# Altium footprint library 接口库PCB.PcbLib: 76 footprints (part 3 of 5)
Each footprint in its own frame and in the unit in brackets; x right, y up, seen from the top. Pads: shape width x height; smd on the part's side, far side on the other; paste and mask are expansions set on the pad; w line width, h text height; cw(c..) or ccw(c..) is an arc to the next point about the centre after c.
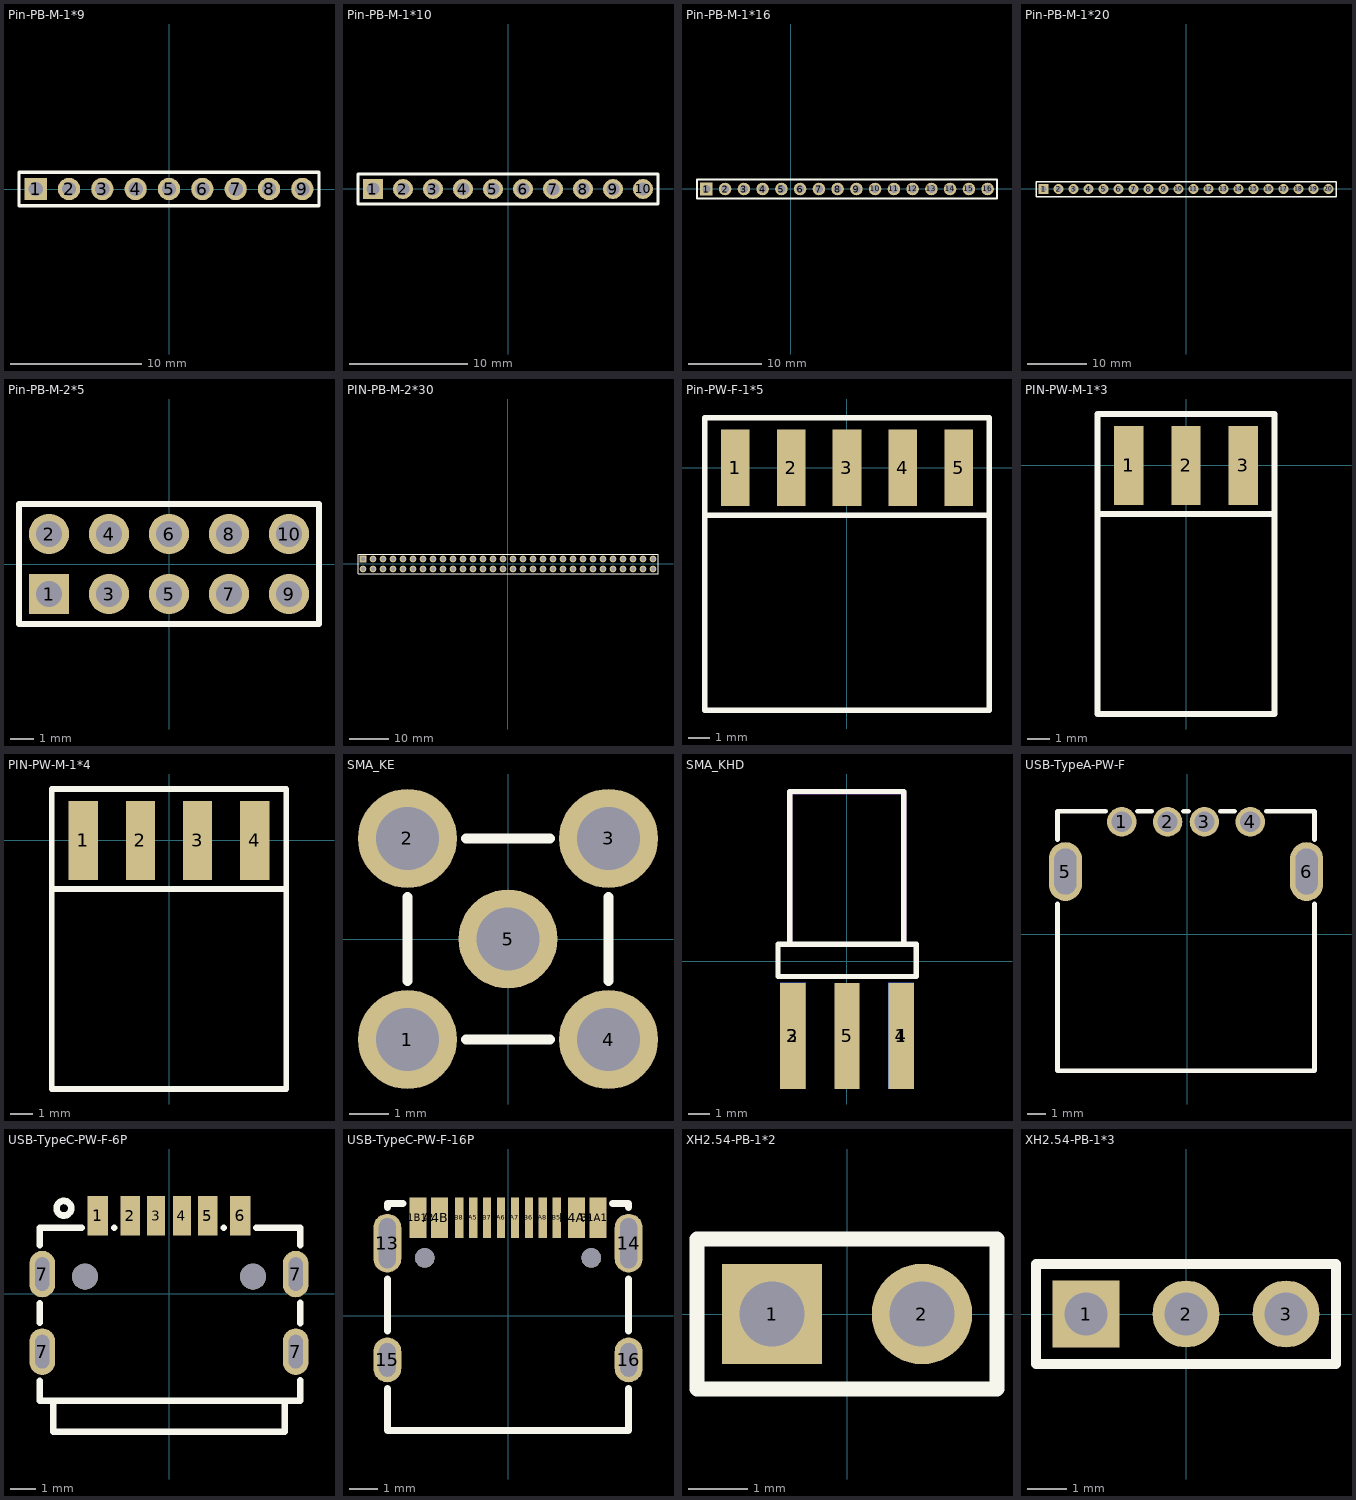
[diagram p2: the footprints below, top view; thin cyan lines are the x and y axes]

## Pin-PB-M-1*9 [mm]
pads (9):
  rect 1.7x1.7 hole 1.1: 1(-10.16,0)
  round 1.7 hole 1.1: 2(-7.62,0) 3(-5.08,0) 4(-2.54,0) 5(0,0) 6(2.54,0) 7(5.08,0) 8(7.62,0) 9(10.16,0)
Top Overlay:
  lines w0.254: -11.43,-1.27 11.43,-1.27 11.43,1.27 -11.43,1.27 -11.43,-1.27
3D body "9P.step": height 8.54, standoff -3, extent -11.43,-1.27 11.43,1.27

## Pin-PB-M-1*10 [mm]
pads (10):
  rect 1.7x1.7 hole 1.1: 1(-11.43,0)
  round 1.7 hole 1.1: 2(-8.89,0) 3(-6.35,0) 4(-3.81,0) 5(-1.27,0) 6(1.27,0) 7(3.81,0) 8(6.35,0) 9(8.89,0) 10(11.43,0)
Top Overlay:
  lines w0.254: -12.7,-1.27 12.7,-1.27 12.7,1.27 -12.7,1.27 -12.7,-1.27
3D body "10P.step": height 8.54, standoff -3, extent -12.7,-1.27 12.7,1.27

## Pin-PB-M-1*16 [mm]
pads (16):
  rect 1.7x1.7 hole 1.1: 1(-11.43,0)
  round 1.7 hole 1.1: 2(-8.89,0) 3(-6.35,0) 4(-3.81,0) 5(-1.27,0) 6(1.27,0) 7(3.81,0) 8(6.35,0) 9(8.89,0) 10(11.43,0) 11(13.97,0) 12(16.51,0) 13(19.05,0) 14(21.59,0) 15(24.13,0) 16(26.67,0)
Top Overlay:
  lines w0.254: -12.7,-1.27 27.94,-1.27 27.94,1.27 -12.7,1.27 -12.7,-1.27
3D body "6P.step": height 8.54, standoff -3, extent 12.7,-1.27 27.94,1.27
3D body "10P.step": height 8.54, standoff -3, extent -12.7,-1.27 12.7,1.27

## Pin-PB-M-1*20 [mm]
pads (20):
  rect 1.7x1.7 hole 1.1: 1(-24.13,0)
  round 1.7 hole 1.1: 2(-21.59,0) 3(-19.05,0) 4(-16.51,0) 5(-13.97,0) 6(-11.43,0) 7(-8.89,0) 8(-6.35,0) 9(-3.81,0) 10(-1.27,0) 11(1.27,0) 12(3.81,0) 13(6.35,0) 14(8.89,0) 15(11.43,0) 16(13.97,0) 17(16.51,0) 18(19.05,0) 19(21.59,0) 20(24.13,0)
Top Overlay:
  lines w0.254: -25.4,-1.27 25.4,-1.27 25.4,1.27 -25.4,1.27 -25.4,-1.27
3D body "20P.step": height 8.54, standoff -3, extent -25.4,-1.27 25.4,1.27

## Pin-PB-M-2*5 [mm]
pads (10):
  rect 1.7x1.7 hole 1.1: 1(-5.08,-1.27)
  round 1.7 hole 1.1: 2(-5.08,1.27) 3(-2.54,-1.27) 4(-2.54,1.27) 5(0,-1.27) 6(0,1.27) 7(2.54,-1.27) 8(2.54,1.27) 9(5.08,-1.27) 10(5.08,1.27)
Top Overlay:
  lines w0.254: -6.35,-2.54 6.35,-2.54 6.35,2.54 -6.35,2.54 -6.35,-2.54
3D body "5P2.step": height 8.54, standoff -3, extent -6.35,-2.54 6.35,2.54

## PIN-PB-M-2*30 [mm]
pads (60):
  rect 1.7x1.7 hole 1.1: 1(-36.83,1.27)
  round 1.7 hole 1.1: 2(-34.29,1.27) 3(-31.75,1.27) 4(-29.21,1.27) 5(-26.67,1.27) 6(-24.13,1.27) 7(-21.59,1.27) 8(-19.05,1.27) 9(-16.51,1.27) 10(-13.97,1.27) 11(-11.43,1.27) 12(-8.89,1.27) 13(-6.35,1.27) 14(-3.81,1.27) 15(-1.27,1.27) 16(1.27,1.27) 17(3.81,1.27) 18(6.35,1.27) 19(8.89,1.27) 20(11.43,1.27) 21(13.97,1.27) 22(16.51,1.27) 23(19.05,1.27) 24(21.59,1.27) 25(24.13,1.27) 26(26.67,1.27) 27(29.21,1.27) 28(31.75,1.27) 29(34.29,1.27) 30(36.83,1.27) 31(36.83,-1.27) 32(34.29,-1.27) 33(31.75,-1.27) 34(29.21,-1.27) 35(26.67,-1.27) 36(24.13,-1.27) 37(21.59,-1.27) 38(19.05,-1.27) 39(16.51,-1.27) 40(13.97,-1.27) 41(11.43,-1.27) 42(8.89,-1.27) 43(6.35,-1.27) 44(3.81,-1.27) 45(1.27,-1.27) 46(-1.27,-1.27) 47(-3.81,-1.27) 48(-6.35,-1.27) 49(-8.89,-1.27) 50(-11.43,-1.27) 51(-13.97,-1.27) 52(-16.51,-1.27) 53(-19.05,-1.27) 54(-21.59,-1.27) 55(-24.13,-1.27) 56(-26.67,-1.27) 57(-29.21,-1.27) 58(-31.75,-1.27) 59(-34.29,-1.27) 60(-36.83,-1.27)
Top Overlay:
  lines w0.254: -38.1,-2.54 38.1,-2.54 38.1,2.54 -38.1,2.54 -38.1,-2.54
3D body "10P.step": height 8.54, standoff -3, extent -38.1,-2.54 -12.7,0
3D body "10P.step": height 8.54, standoff -3, extent -12.7,-2.54 12.7,0
3D body "10P.step": height 8.54, standoff -3, extent 12.7,-2.54 38.1,0
3D body "10P.step": height 8.54, standoff -3, extent 12.7,0 38.1,2.54
3D body "10P.step": height 8.54, standoff -3, extent -12.7,0 12.7,2.54
3D body "10P.step": height 8.54, standoff -3, extent -38.1,0 -12.7,2.54

## Pin-PW-F-1*5 [mm]
pads (6):
  rect 1.3x3.5 smd: 1(-5.08,0) 1(-5.08,0) 2(-2.54,0) 3(0,0) 4(2.54,0) 5(5.08,0)
Top Overlay:
  lines w0.254: 3.937,-2.159 -6.477,-2.159 ; -6.477,-2.159 -6.477,-11.049 6.477,-11.049 6.477,-2.159 ; -6.477,-2.159 -6.477,2.286 6.477,2.286 6.477,-2.159 ; -6.477,-2.159 6.477,-2.159
3D body "5P.step": height 1.27, standoff -1.27, extent -6.35,-10.977 6.35,0.563

## PIN-PW-M-1*3 [mm]
pads (4):
  rect 1.3x3.5 smd: 1(-2.54,0) 1(-2.54,0) 2(0,0) 3(2.54,0)
Top Overlay:
  lines w0.254: -3.937,-11.049 3.937,-11.049 3.937,-2.159 ; -3.937,-11.049 -3.937,-2.159 ; -3.937,-11.049 -3.937,-2.159 ; -3.937,-2.159 3.937,-2.159 ; -3.937,-2.159 3.937,-2.159 ; -3.937,-2.159 -3.937,2.286 ; -3.937,-2.159 -3.937,2.286 ; -3.937,2.286 3.937,2.286 3.937,-2.159
3D body "3P.step": height 1.27, standoff -1.27, extent -3.81,-10.977 3.81,0.563

## PIN-PW-M-1*4 [mm]
pads (5):
  rect 1.3x3.5 smd: 1(-3.81,0) 1(-3.81,0) 2(-1.27,0) 3(1.27,0) 4(3.81,0)
Top Overlay:
  lines w0.254: -5.207,-2.159 5.207,-2.159 ; -5.207,-2.159 -5.207,2.286 5.207,2.286 5.207,-2.159 ; -5.207,-2.159 5.207,-2.159 ; -5.207,-2.159 -5.207,-11.049 5.207,-11.049 5.207,-2.159
3D body "4P.step": height 1.27, standoff -1.27, extent -5.08,-10.977 5.08,0.563

## SMA_KE [mm]
pads (5):
  round 2.5 hole 1.6: 1(-2.54,-2.54) 2(-2.54,2.54) 3(2.54,2.54) 4(2.54,-2.54) 5(0,0)
Top Overlay:
  lines w0.254: -2.54,-1.059 -2.54,1.059 ; -1.059,-2.54 1.059,-2.54 ; -1.059,2.54 1.059,2.54 ; 2.54,-1.059 2.54,1.059
Mechanical 15:
  lines w0.003: 1.143,0.127 1.143,0.127
3D body "User Library-sma.step": height 9.2, standoff -4.25, extent -3.155,-3.155 3.155,3.155

## SMA_KHD [mm]
pads (5):
  rect 1.2x5 smd: 1(2.55,-3.501) 2(-2.55,-3.501) 5(0,-3.501)
  rect 1.2x5 smd far side: 3(-2.55,-3.501) 4(2.55,-3.501)
Top Overlay:
  lines w0.254: -2.689,0.817 -2.689,7.444 -2.689,7.988 -2.7,7.999 2.68,7.999 ; 2.667,0.817 2.667,7.444 2.667,7.999 ; 3.175,-0.707 -3.25,-0.707 -3.25,0.817 3.25,0.817 3.25,-0.707
Mechanical 15:
  region: -2.81,0.929 -2.57,0.929 -2.57,7.879 2.55,7.879 2.55,0.929 2.79,0.929 2.79,7.999 2.67,8.119 -2.72,8.119 -2.81,8.029
3D body "ALSRobot-SMA-KHD19A (1).step": height 3.2, standoff -2.9, extent -3.075,-5.575 3.025,7.925

## USB-TypeA-PW-F [mm]
pads (6):
  round 1.6 hole 1.1: 1(-3.577,6.134) 2(-1.077,6.134) 3(0.923,6.134) 4(3.423,6.134)
  oval 1.8x3.2 hole 1.2 slot 2.5 at 90 deg: 5(-6.646,3.425) 6(6.492,3.424)
Top Overlay:
  lines w0.254: -7.077,1.679 -7.077,-6.9 -7.077,-7.431 5.676,-7.431 6.923,-7.431 ; -7.077,5.171 -7.077,6.7 -4.439,6.7 ; -2.715,6.7 -1.939,6.7 ; -0.215,6.7 0.061,6.7 ; 1.785,6.7 2.561,6.7 ; 4.285,6.7 6.923,6.7 6.923,5.171 ; 6.923,-7.101 6.923,-7.431 ; 6.923,1.679 6.923,-7.431
3D body "usb_a-usbsa.stp": height 7, standoff -4.5, extent -7.8,-7.088 7.8,7.112

## USB-TypeC-PW-F-6P [mm]
pads (12):
  rect 0.8x1.524 smd: 1(-2.75,3.016) 6(2.75,3.016)
  rect 0.76x1.524 smd: 2(-1.5,3.016) 5(1.5,3.016)
  rect 0.7x1.524 smd: 3(-0.5,3.016) 4(0.5,3.016)
  oval 1x1.8 hole 0.55 slot 1.3 at 90 deg: 7(-4.9,-2.234) 7(-4.9,0.766) 7(4.9,0.766) 7(4.9,-2.234)
  round 1 hole 1 unplated: ""(-3.25,0.666) ""(3.25,0.666)
Top Overlay:
  circle w0.254: c-4.064,3.312 r0.284
  lines w0.254: -5,-3.358 -5,-4.134 5,-4.134 ; -5,-1.11 -5,-0.358 ; -5,1.89 -5,2.55 -3.381,2.55 ; -4.47,-4.134 -4.47,-5.334 4.47,-5.334 4.47,-4.134 ; -2.119,2.55 -2.111,2.55 ; 2.111,2.55 2.119,2.55 ; 3.381,2.55 4.953,2.55 5.08,2.55 5.08,1.875 ; 5.08,-4.134 5.08,-3.341 5.08,-3.343 ; 5.08,-1.127 5.08,-0.341 ; 5.08,-1.125 5.08,-0.343 ; -5,-0.358 -5,-0.358
Top Paste:
  region: -5.4,-1.834 -5.4,-1.735 -5.324,-1.551 -5.183,-1.41 -4.999,-1.334 -4.801,-1.334 -4.617,-1.41 -4.476,-1.551 -4.4,-1.735 -4.4,-1.834 -4.4,-2.634 -4.4,-2.733 -4.476,-2.917 -4.617,-3.058 -4.801,-3.134 -4.999,-3.134 -5.183,-3.058 -5.324,-2.917 -5.4,-2.733 -5.4,-2.634
  region: -5.4,1.166 -5.4,1.265 -5.324,1.449 -5.183,1.59 -4.999,1.666 -4.801,1.666 -4.617,1.59 -4.476,1.449 -4.4,1.265 -4.4,1.166 -4.4,0.366 -4.4,0.267 -4.476,0.083 -4.617,-0.058 -4.801,-0.134 -4.999,-0.134 -5.183,-0.058 -5.324,0.083 -5.4,0.267 -5.4,0.366
  region: -3.15,3.778 -2.35,3.778 -2.35,2.254 -3.15,2.254
  region: -1.88,3.778 -1.12,3.778 -1.12,2.254 -1.88,2.254
  region: -0.85,3.778 -0.15,3.778 -0.15,2.254 -0.85,2.254
  region: 0.15,3.778 0.85,3.778 0.85,2.254 0.15,2.254
  region: 1.12,3.778 1.88,3.778 1.88,2.254 1.12,2.254
  region: 4.4,1.166 4.4,1.265 4.476,1.449 4.617,1.59 4.801,1.666 4.999,1.666 5.183,1.59 5.324,1.449 5.4,1.265 5.4,1.166 5.4,0.366 5.4,0.267 5.324,0.083 5.183,-0.058 4.999,-0.134 4.801,-0.134 4.617,-0.058 4.476,0.083 4.4,0.267 4.4,0.366
  region: 2.35,3.778 3.15,3.778 3.15,2.254 2.35,2.254
  region: 4.4,-1.834 4.4,-1.735 4.476,-1.551 4.617,-1.41 4.801,-1.334 4.999,-1.334 5.183,-1.41 5.324,-1.551 5.4,-1.735 5.4,-1.834 5.4,-2.634 5.4,-2.733 5.324,-2.917 5.183,-3.058 4.999,-3.134 4.801,-3.134 4.617,-3.058 4.476,-2.917 4.4,-2.733 4.4,-2.634
Mechanical 15:
  circle w0.4: c3.25,0.666 r0.2
  circle w0.4: c-3.25,0.666 r0.2
3D body "�ޱ���.step": height 4.85, standoff -1.11, extent -5.27,-5.318 5.27,3.032

## USB-TypeC-PW-F-16P [mm]
pads (18):
  oval 1x2.1 hole 0.6 slot 1.8 at 90 deg: 13(-4.32,2.6) 14(4.32,2.6)
  oval 1x1.6 hole 0.6 slot 1.2 at 90 deg: 15(-4.32,-1.58) 16(4.32,-1.58)
  rect 0.6x1.45 smd: A1B12(-3.225,3.515) A4B9(-2.45,3.515) B1A12(3.22,3.515) B4A9(2.45,3.515)
  rect 0.3x1.45 smd: A5(-1.25,3.514) A6(-0.25,3.515) A7(0.25,3.515) A8(1.25,3.515) B5(1.75,3.515) B6(0.75,3.515) B7(-0.75,3.515) B8(-1.75,3.515)
  round 0.7 hole 0.7 unplated: ""(-2.98,2.07) ""(2.98,2.07)
Top Overlay:
  lines w0.254: -4.318,-2.611 -4.318,-4.113 4.318,-4.113 4.318,-2.611 ; -4.318,-0.549 -4.318,1.319 ; -4.318,3.881 -4.318,4.015 -3.756,4.015 ; 3.751,4.015 4.318,4.015 4.318,3.881 ; 4.318,-0.549 4.318,1.319
3D body "User Library-USB Type C Port (SMD Type).step": height 3.13, standoff -1.07, extent -4.47,-4.125 4.47,3.775

## XH2.54-PB-1*2 [mm]
pads (2):
  rect 1.7x1.7 hole 1.1: 1(-1.27,0)
  round 1.7 hole 1.1: 2(1.27,0)
Top Overlay:
  lines w0.254: -2.54,-1.27 2.54,-1.27 2.54,1.27 -2.54,1.27 -2.54,-1.27
3D body "2p.step": height 7, standoff -3.4, extent -3.7,-2.286 3.7,3.464

## XH2.54-PB-1*3 [mm]
pads (3):
  rect 1.7x1.7 hole 1.1: 1(-2.54,0)
  round 1.7 hole 1.1: 2(0,0) 3(2.54,0)
Top Overlay:
  lines w0.254: -3.81,-1.27 -3.81,1.27 3.81,1.27 3.81,-1.27 -3.81,-1.27
3D body "3P.step": height 7, standoff -3.4, extent -4.91,-2.286 4.91,3.464